# Altium footprint library 213_Final_Project.PcbLib: 31 footprints (part 1 of 2)
Each footprint in its own frame and in the unit in brackets; x right, y up, seen from the top. Pads: shape width x height; smd on the part's side, far side on the other; paste and mask are expansions set on the pad; w line width, h text height; cw(c..) or ccw(c..) is an arc to the next point about the centre after c.
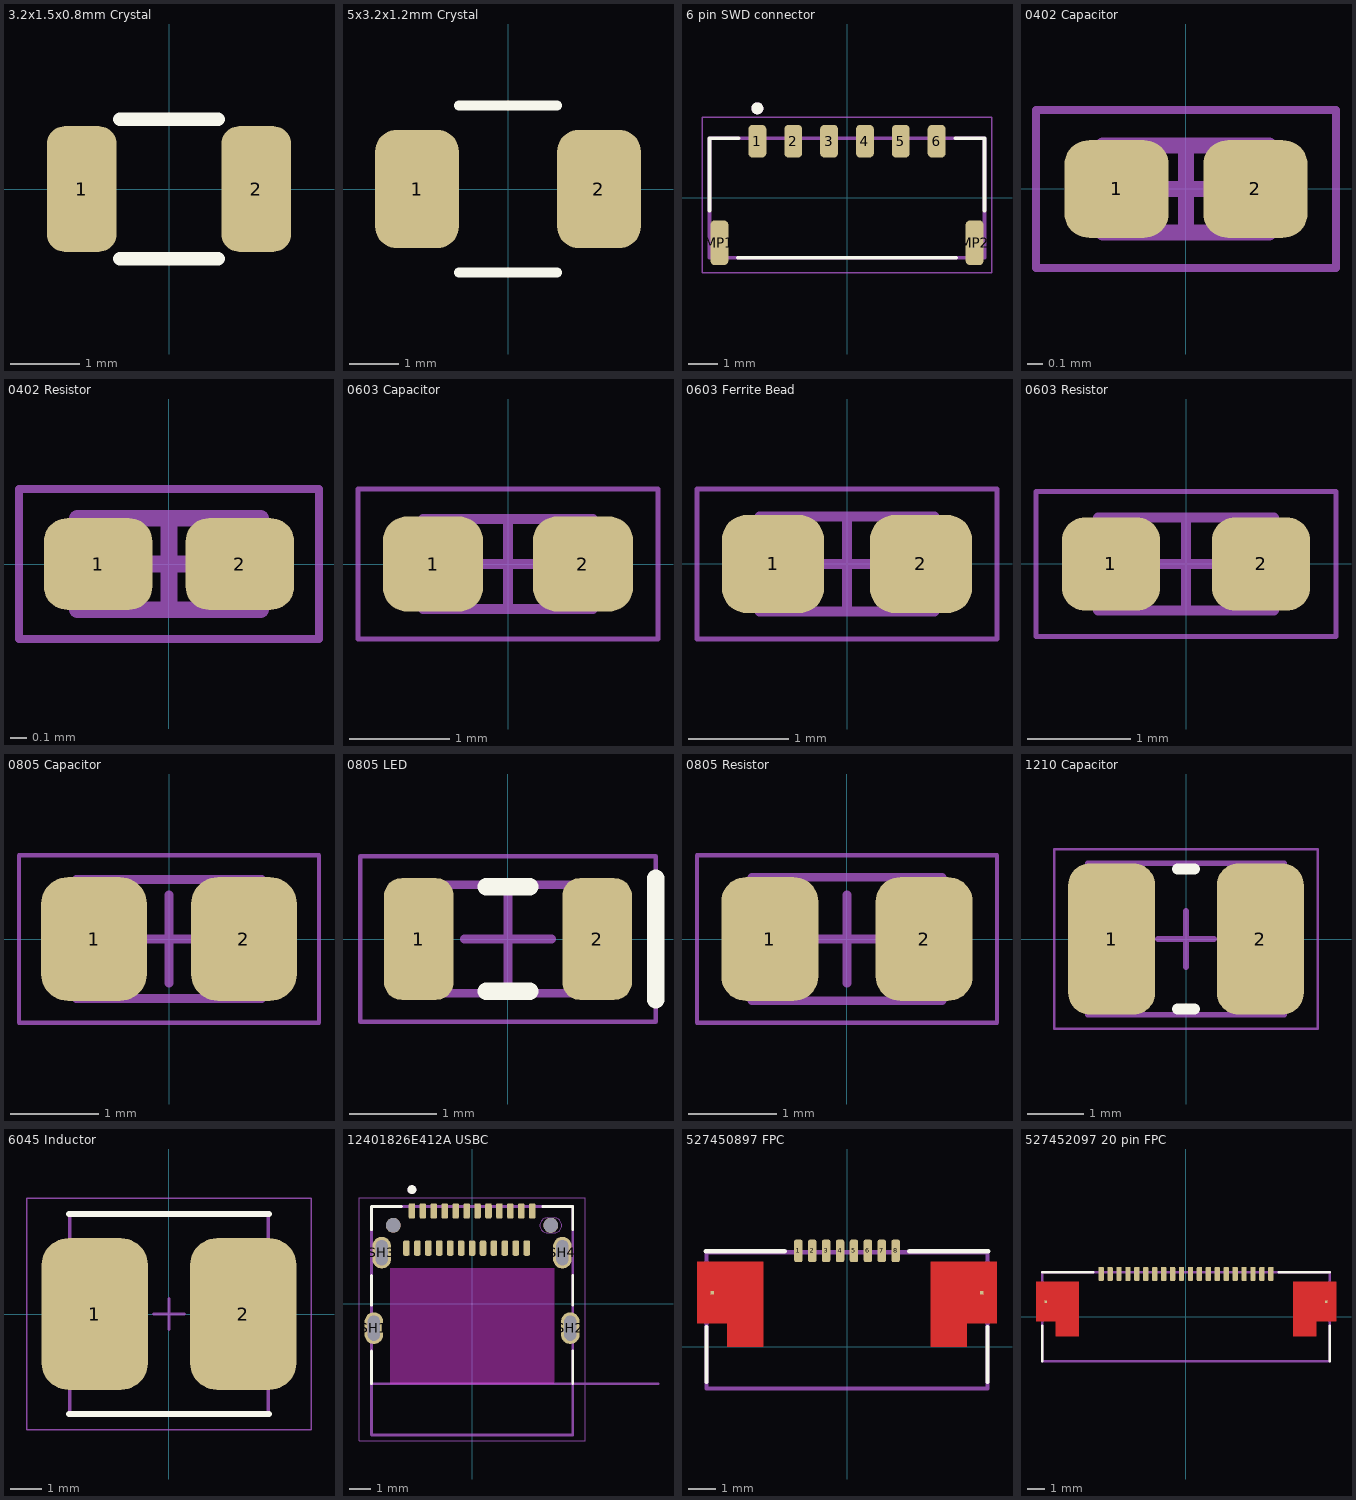
[diagram p0: the footprints below, top view; thin cyan lines are the x and y axes]

## 3.2x1.5x0.8mm Crystal [mm]
pads (2):
  rrect50% 1x1.8 smd: 1(-1.25,0) 2(1.25,0)
Top Overlay:
  lines w0.2: -0.7,-1 0.7,-1 ; -0.7,1 0.7,1
3D body "Crystal3215 (Generic).stp": height 0.8, standoff -0.03, extent -1.6,-0.75 1.6,0.75

## 5x3.2x1.2mm Crystal [mm]
pads (2):
  rrect50% 1.7x2.4 smd: 1(-1.85,0) 2(1.85,0)
Top Overlay:
  lines w0.2: -1,-1.7 1,-1.7 ; -1,1.7 1,1.7
3D body "Crystal5032 (Generic).step": height 0.8, standoff 0, extent -2.5,-1.6 2.5,1.6

## 6 pin SWD connector [mm]
pads (8):
  rrect50% 0.6x1.1 smd: 1(-3,1.9) 2(-1.8,1.9) 3(-0.6,1.9) 4(0.6,1.9) 5(1.8,1.9) 6(3,1.9)
  rrect50% 0.6x1.5 smd: MP1(-4.27,-1.5) MP2(4.27,-1.5)
Top Overlay:
  circle w0.2: c-3,3 r0.1
  lines w0.127: -4.6,-0.43 -4.6,2 -3.62,2 ; -3.65,-2 3.65,-2 ; 3.62,2 4.6,2 4.6,-0.43
Mechanical 13:
  circle w0.2: c-3,3 r0.1
  lines w0.127: -4.6,-2 4.6,-2 4.6,2 -4.6,2 -4.6,-2
Mechanical 15:
  lines w0.05: -4.85,-2.5 -4.85,2.7 4.85,2.7 4.85,-2.5 -4.85,-2.5
3D body "10125839-06RAEHLF.STEP": height 2.5, standoff -0.03, extent -4.6,-2 4.6,2.2

## 0402 Capacitor [mm] "Chip Capacitor, 2-Leads, Body 1.00x0.50mm, IPC Medium Density"
height 0.4
pads (2):
  rrect50% 0.66x0.62 smd: 1(-0.44,0) 2(0.44,0)
Mechanical 13:
  lines w0.1: -0.525,-0.275 0.525,-0.275 0.525,0.275 -0.525,0.275 -0.525,-0.275
Mechanical 15:
  lines w0.05: -0.95,-0.5 0.95,-0.5 0.95,0.5 -0.95,0.5 -0.95,-0.5
  lines w0.1: -0.275,0 0.275,0 ; 0,-0.275 0,0.275
3D body "Cap0402 (Generic).stp": height 0.5, standoff 0, extent -0.5,-0.25 0.5,0.25

## 0402 Resistor [mm] "Chip Resistor, 2-Leads, Body 1.00x0.50mm, IPC Medium Density"
height 0.4
pads (2):
  rrect50% 0.65x0.55 smd: 1(-0.425,0) 2(0.425,0)
Mechanical 13:
  lines w0.1: -0.55,-0.275 -0.55,0.275 0.55,0.275 0.55,-0.275 -0.55,-0.275
Mechanical 15:
  lines w0.05: -0.9,-0.45 -0.9,0.45 0.9,0.45 0.9,-0.45 -0.9,-0.45
  lines w0.1: -0.275,0 0.275,0 ; 0,-0.275 0,0.275
3D body "Res0402 (Generic).stp": height 0.35, standoff 0, extent -0.5,-0.25 0.5,0.25

## 0603 Capacitor [mm] "Chip Capacitor, 2-Leads, Body 1.60x0.80mm, IPC Medium Density"
height 0.6
pads (2):
  rrect50% 1x0.95 smd: 1(-0.75,0) 2(0.75,0)
Mechanical 13:
  lines w0.1: -0.85,-0.45 -0.85,0.45 0.85,0.45 0.85,-0.45 -0.85,-0.45
Mechanical 15:
  lines w0.05: -1.5,-0.75 -1.5,0.75 1.5,0.75 1.5,-0.75 -1.5,-0.75
  lines w0.1: -0.45,0 0.45,0 ; 0,-0.45 0,0.45
3D body "Cap0603 (Generic).stp": height 0.8, standoff 0, extent -0.8,-0.4 0.8,0.4

## 0603 Ferrite Bead [mm] "Chip Ferrite Bead, 2-Leads, Body 1.60x0.80mm, IPC Medium Density"
height 0.7
pads (2):
  rrect50% 1.02x0.98 smd: 1(-0.74,0) 2(0.74,0)
Mechanical 13:
  lines w0.1: -0.875,-0.475 0.875,-0.475 0.875,0.475 -0.875,0.475 -0.875,-0.475
Mechanical 15:
  lines w0.05: -1.5,-0.75 1.5,-0.75 1.5,0.75 -1.5,0.75 -1.5,-0.75
  lines w0.1: -0.475,0 0.475,0 ; 0,-0.475 0,0.475
3D body "FB0603.STEP": height 0.8, standoff 0, extent -0.8,-0.4 0.8,0.4

## 0603 Resistor [mm] "Chip Resistor, 2-Leads, Body 1.60x0.80mm, IPC Medium Density"
height 0.55
pads (2):
  rrect50% 0.95x0.9 smd: 1(-0.725,0) 2(0.725,0)
Mechanical 13:
  lines w0.1: -0.85,-0.45 -0.85,0.45 0.85,0.45 0.85,-0.45 -0.85,-0.45
Mechanical 15:
  lines w0.05: -1.45,-0.7 -1.45,0.7 1.45,0.7 1.45,-0.7 -1.45,-0.7
  lines w0.1: -0.45,0 0.45,0 ; 0,-0.45 0,0.45
3D body "Res0603 (Generic).stp": height 0.45, standoff 0, extent -0.8,-0.4 0.8,0.4

## 0805 Capacitor [mm] "Chip Capacitor, 2-Leads, Body 2.00x1.25mm, IPC Medium Density"
height 1
pads (2):
  rrect50% 1.2x1.4 smd: 1(-0.85,0) 2(0.85,0)
Mechanical 13:
  lines w0.1: -1.05,-0.675 1.05,-0.675 1.05,0.675 -1.05,0.675 -1.05,-0.675
Mechanical 15:
  lines w0.05: -1.7,-0.95 1.7,-0.95 1.7,0.95 -1.7,0.95 -1.7,-0.95
  lines w0.1: -0.5,0 0.5,0 ; 0,-0.5 0,0.5
3D body "Cap0805 (Generic).stp": height 1.25, standoff 0, extent -1,-0.625 1,0.625

## 0805 LED [mm] "Chip LED. 2-Leads, Body 2.00x1.25mm, IPC Medium Density"
height 0.6
pads (2):
  rrect50% 0.8x1.4 smd: 1(-1.025,0) 2(1.025,0)
Top Overlay:
  lines w0.2: -0.25,-0.6 0.25,-0.6 ; -0.25,0.6 0.25,0.6 ; 1.7,-0.7 1.7,0.7
Mechanical 13:
  lines w0.1: -1,-0.625 -1,0.625 1,0.625 1,-0.625 -1,-0.625
Mechanical 15:
  lines w0.05: -1.7,-0.95 -1.7,0.95 1.7,0.95 1.7,-0.95 -1.7,-0.95
  lines w0.1: -0.5,0 0.5,0 ; 0,-0.5 0,0.5
3D body "LED0805 (Generic).step": height 0.78, standoff 0, extent -1,-0.625 1,0.625

## 0805 Resistor [mm] "Chip Resistor, 2-Leads, Body 2.00x1.25mm, IPC Medium Density"
height 0.6
pads (2):
  rrect50% 1.1x1.4 smd: 1(-0.875,0) 2(0.875,0)
Mechanical 13:
  lines w0.1: -1.075,-0.7 1.075,-0.7 1.075,0.7 -1.075,0.7 -1.075,-0.7
Mechanical 15:
  lines w0.05: -1.7,-0.95 1.7,-0.95 1.7,0.95 -1.7,0.95 -1.7,-0.95
  lines w0.1: -0.5,0 0.5,0 ; 0,-0.5 0,0.5
3D body "Res0805 (Generic).stp": height 0.5, standoff 0, extent -1,-0.625 1,0.625

## 1210 Capacitor [mm] "Chip Capacitor, 2-Leads, Body 3.20x2.50mm, IPC Medium Density"
height 1.2
pads (2):
  rrect50% 1.55x2.7 smd: 1(-1.325,0) 2(1.325,0)
Top Overlay:
  lines w0.2: -0.15,-1.25 0.15,-1.25 ; -0.15,1.25 0.15,1.25
Mechanical 13:
  lines w0.1: -1.75,-1.35 -1.75,1.35 1.75,1.35 1.75,-1.35 -1.75,-1.35
Mechanical 15:
  lines w0.05: -2.35,-1.6 -2.35,1.6 2.35,1.6 2.35,-1.6 -2.35,-1.6
  lines w0.1: -0.5,0 0.5,0 ; 0,-0.5 0,0.5
3D body "Cap1210 (Generic).stp": height 1.9, standoff 0, extent -1.6,-1.25 1.6,1.25

## 6045 Inductor [mm] "Precision Wire Wound Inductor, 2-Leads, Body 6.00x6.00mm, IPC Low Density"
height 4.5
pads (2):
  rrect50% 3.4x4.85 smd: 1(-2.375,0) 2(2.375,0)
Top Overlay:
  lines w0.2: -3.2,-3.2 3.2,-3.2 ; -3.2,3.2 3.2,3.2
Mechanical 13:
  lines w0.1: -3.175,-3.175 -3.175,3.175 3.175,3.175 3.175,-3.175 -3.175,-3.175
Mechanical 15:
  lines w0.05: -4.55,-3.7 -4.55,3.7 4.55,3.7 4.55,-3.7 -4.55,-3.7
  lines w0.1: -0.5,0 0.5,0 ; 0,-0.5 0,0.5
3D body "PNR6045 (Generic).STEP": height 4.05, standoff 0, extent -3,-2.99 3,3.005

## 12401826E412A USBC [mm]
pads (30):
  rrect50% 0.3x0.7 smd mask+0.05: A1(-2.75,4.25) A2(-2.25,4.25) A3(-1.75,4.25) A4(-1.25,4.25) A5(-0.75,4.25) A6(-0.25,4.25) A7(0.25,4.25) A8(0.75,4.25) A9(1.25,4.25) A10(1.75,4.25) A11(2.25,4.25) A12(2.75,4.25) B1(2.5,2.55) B2(2,2.55) B3(1.5,2.55) B4(1,2.55) B5(0.5,2.55) B6(0,2.55) B7(-0.5,2.55) B8(-1,2.55) B9(-1.5,2.55) B10(-2,2.55) B11(-2.5,2.55) B12(-3,2.55)
  oval 0.85x1.45 hole 0.55 slot 1.15 at 90 deg: SH1(-4.49,-1.11) SH2(4.49,-1.11) SH3(-4.13,2.34) SH4(4.13,2.34)
  round 0.675 hole 0.675 unplated: ""(-3.6,3.59) ""(3.6,3.59)
Top Overlay:
  circle w0.2: c-2.75,5.225 r0.1
  lines w0.127: -4.6,-3.65 -4.6,-2.155 ; -4.6,-0.065 -4.6,1.295 ; -4.6,3.385 -4.6,4.45 -3.23,4.45 ; 3.23,4.45 4.6,4.45 4.6,3.385 ; 4.6,-3.65 4.6,-2.155 ; 4.6,-0.065 4.6,1.295
Top Solder:
  region: 3.808,4.025 3.831,4.022 3.853,4.018 3.876,4.013 3.898,4.006 3.919,3.998 3.94,3.99 3.961,3.98 3.981,3.969 4.001,3.957 4.02,3.944 4.038,3.93 4.055,3.915 4.072,3.899 4.088,3.883 4.103,3.865 4.116,3.847 4.129,3.828 4.141,3.809 4.152,3.789 4.162,3.768 4.171,3.747 4.179,3.725 4.185,3.703 4.19,3.681 4.195,3.658 4.198,3.636 4.199,3.613 4.2,3.59 4.199,3.567 4.198,3.544 4.195,3.522 4.19,3.499 4.185,3.477 4.179,3.455 4.171,3.433 4.162,3.412 4.152,3.391 4.141,3.371 4.129,3.352 4.116,3.333 4.103,3.315 4.088,3.297 4.072,3.281 4.055,3.265 4.038,3.25 4.02,3.236 4.001,3.223 3.981,3.211 3.961,3.2 3.94,3.19 3.919,3.182 3.898,3.174 3.876,3.167 3.853,3.162 3.831,3.158 3.808,3.155 3.785,3.153 3.763,3.152 3.438,3.152 3.437,3.153 3.415,3.153 3.392,3.155 3.369,3.158 3.347,3.162 3.324,3.167 3.302,3.174 3.281,3.182 3.26,3.19 3.239,3.2 3.219,3.211 3.199,3.223 3.18,3.236 3.162,3.25 3.145,3.265 3.128,3.281 3.112,3.297 3.097,3.315 3.084,3.333 3.071,3.352 3.059,3.371 3.048,3.391 3.038,3.412 3.029,3.433 3.021,3.455 3.015,3.477 3.01,3.499 3.005,3.522 3.002,3.544 3.001,3.567 3,3.59 3.001,3.613 3.002,3.636 3.005,3.658 3.01,3.681 3.015,3.703 3.021,3.725 3.029,3.747 3.038,3.768 3.048,3.789 3.059,3.809 3.071,3.828 3.084,3.847 3.097,3.865 3.112,3.883 3.128,3.899 3.145,3.915 3.162,3.93 3.18,3.944 3.199,3.957 3.219,3.969 3.239,3.98 3.26,3.99 3.281,3.998 3.302,4.006 3.324,4.013 3.347,4.018 3.369,4.022 3.392,4.025 3.415,4.027 3.785,4.027
Bottom Solder:
  region: 3.808,4.025 3.831,4.022 3.853,4.018 3.876,4.013 3.898,4.006 3.919,3.998 3.94,3.99 3.961,3.98 3.981,3.969 4.001,3.957 4.02,3.944 4.038,3.93 4.055,3.915 4.072,3.899 4.088,3.883 4.103,3.865 4.116,3.847 4.129,3.828 4.141,3.809 4.152,3.789 4.162,3.768 4.171,3.747 4.179,3.725 4.185,3.703 4.19,3.681 4.195,3.658 4.198,3.636 4.199,3.613 4.2,3.59 4.199,3.567 4.198,3.544 4.195,3.522 4.19,3.499 4.185,3.477 4.179,3.455 4.171,3.433 4.162,3.412 4.152,3.391 4.141,3.371 4.129,3.352 4.116,3.333 4.103,3.315 4.088,3.297 4.072,3.281 4.055,3.265 4.038,3.25 4.02,3.236 4.001,3.223 3.981,3.211 3.961,3.2 3.94,3.19 3.919,3.182 3.898,3.174 3.876,3.167 3.853,3.162 3.831,3.158 3.808,3.155 3.785,3.153 3.762,3.153 3.763,3.152 3.438,3.152 3.415,3.153 3.392,3.155 3.369,3.158 3.347,3.162 3.324,3.167 3.302,3.174 3.281,3.182 3.26,3.19 3.239,3.2 3.219,3.211 3.199,3.223 3.18,3.236 3.162,3.25 3.145,3.265 3.128,3.281 3.112,3.297 3.097,3.315 3.084,3.333 3.071,3.352 3.059,3.371 3.048,3.391 3.038,3.412 3.029,3.433 3.021,3.455 3.015,3.477 3.01,3.499 3.005,3.522 3.002,3.544 3.001,3.567 3,3.59 3.001,3.613 3.002,3.636 3.005,3.658 3.01,3.681 3.015,3.703 3.021,3.725 3.029,3.747 3.038,3.768 3.048,3.789 3.059,3.809 3.071,3.828 3.084,3.847 3.097,3.865 3.112,3.883 3.128,3.899 3.145,3.915 3.162,3.93 3.18,3.944 3.199,3.957 3.219,3.969 3.239,3.98 3.26,3.99 3.281,3.998 3.302,4.006 3.324,4.013 3.347,4.018 3.369,4.022 3.392,4.025 3.415,4.027 3.785,4.027
Keep-Out Layer:
  region: 3.75,-3.65 -3.75,-3.65 -3.75,1.64 3.75,1.64
Mechanical 1:
  lines w0: 3.1,3.59 cw(c3.437,3.59) 3.437,3.928 3.762,3.928 cw(c3.762,3.59) 4.1,3.59 cw(c3.762,3.59) 3.762,3.253 3.437,3.253 cw(c3.437,3.59) 3.1,3.59
Mechanical 13:
  circle w0.2: c-2.75,5.225 r0.1
  lines w0.127: 8.5,-3.65 -4.6,-3.65 ; -4.6,-3.65 -4.6,4.45 4.6,4.45 4.6,-6 -4.6,-6 -4.6,-3.65
  text "PCB Edge" at 5.45,-3.375 h0.81
Mechanical 15:
  lines w0.05: -5.165,-6.25 5.165,-6.25 5.165,4.85 -5.165,4.85 -5.165,-6.25
3D body "12401826E412A.stp": height 3.3, standoff -1.88, extent -4.6,-6 4.6,4.5

## 527450897 FPC [mil]
pads (10):
  rrect50% 12x32 smd: 1(-68.9,135.62) 2(-49.21,135.62) 3(-29.53,135.62) 4(-9.84,135.62) 5(9.84,135.62) 6(29.53,135.62) 7(49.21,135.62) 8(68.9,135.62)
  rect 5x5 smd: P1(-190.94,76.57) P2(190.94,76.57)
Top Layer:
  region: 212.44,33.07 169.44,33.07 169.44,0 118.44,0 118.44,120.07 212.44,120.07
  region: -118.44,0 -169.44,0 -169.44,33.07 -212.44,33.07 -212.44,120.07 -118.44,120.07
Top Overlay:
  lines w6: -200,135 -88,135 ; -199,-50 -199,28 ; 88,135 200,135 ; 199,-50 199,28
Top Paste:
  region: -118.44,0 -169.44,0 -169.44,33.07 -212.44,33.07 -212.44,120.07 -118.44,120.07
  region: 212.44,33.07 169.44,33.07 169.44,0 118.44,0 118.44,120.07 212.44,120.07
Top Solder:
  region: -118.44,0 -169.44,0 -169.44,33.07 -212.44,33.07 -212.44,120.07 -118.44,120.07
  region: 212.44,33.07 169.44,33.07 169.44,0 118.44,0 118.44,120.07 212.44,120.07
Mechanical 13:
  lines w6: -199,-59.06 -199,133.86 199,133.86 199,-59.06 -199,-59.06
3D body "0527450897.stp": height 75, standoff 0, extent -198.82,-59.06 198.82,137.8

## 527452097 20 pin FPC [mm]
pads (22):
  rrect50% 0.3x0.8 smd: 1(-4.75,2.4) 2(-4.25,2.4) 3(-3.75,2.4) 4(-3.25,2.4) 5(-2.75,2.4) 6(-2.25,2.4) 7(-1.75,2.4) 8(-1.25,2.4) 9(-0.75,2.4) 10(-0.25,2.4) 11(0.25,2.4) 12(0.75,2.4) 13(1.25,2.4) 14(1.75,2.4) 15(2.25,2.4) 16(2.75,2.4) 17(3.25,2.4) 18(3.75,2.4) 19(4.25,2.4) 20(4.75,2.4)
  rect 0.127x0.127 smd: P1(-7.85,0.845) P2(7.85,0.845)
Top Layer:
  region: -6.008,-1.1 -7.304,-1.1 -7.304,-0.26 -8.396,-0.26 -8.396,1.95 -6.008,1.95
  region: 8.396,-0.26 7.304,-0.26 7.304,-1.1 6.009,-1.1 6.009,1.95 8.396,1.95
Top Overlay:
  lines w0.152: -8.052,-2.489 -8.052,-0.508 ; -8.052,2.489 -5.207,2.489 ; 5.207,2.489 8.052,2.489 ; 8.052,-2.489 8.052,-0.508
Top Paste:
  region: -6.008,-1.1 -7.304,-1.1 -7.304,-0.26 -8.396,-0.26 -8.396,1.95 -6.008,1.95
  region: 8.396,-0.26 7.304,-0.26 7.304,-1.1 6.009,-1.1 6.009,1.95 8.396,1.95
Top Solder:
  region: -6.008,-1.1 -7.304,-1.1 -7.304,-0.26 -8.396,-0.26 -8.396,1.95 -6.008,1.95
  region: 8.396,-0.26 7.304,-0.26 7.304,-1.1 6.009,-1.1 6.009,1.95 8.396,1.95
Mechanical 13:
  lines w0.152: -8.052,-2.489 8.052,-2.489 8.052,2.489 -8.052,2.489 -8.052,-2.489
3D body "0527452097.stp": height 1.91, standoff 0, extent -8.05,-2.578 8.05,2.422